# Altium footprint library TarabusLibrary.PcbLib: 591 footprints (part 25 of 37)
Each footprint in its own frame and in the unit in brackets; x right, y up, seen from the top. Pads: shape width x height; smd on the part's side, far side on the other; paste and mask are expansions set on the pad; w line width, h text height; cw(c..) or ccw(c..) is an arc to the next point about the centre after c.
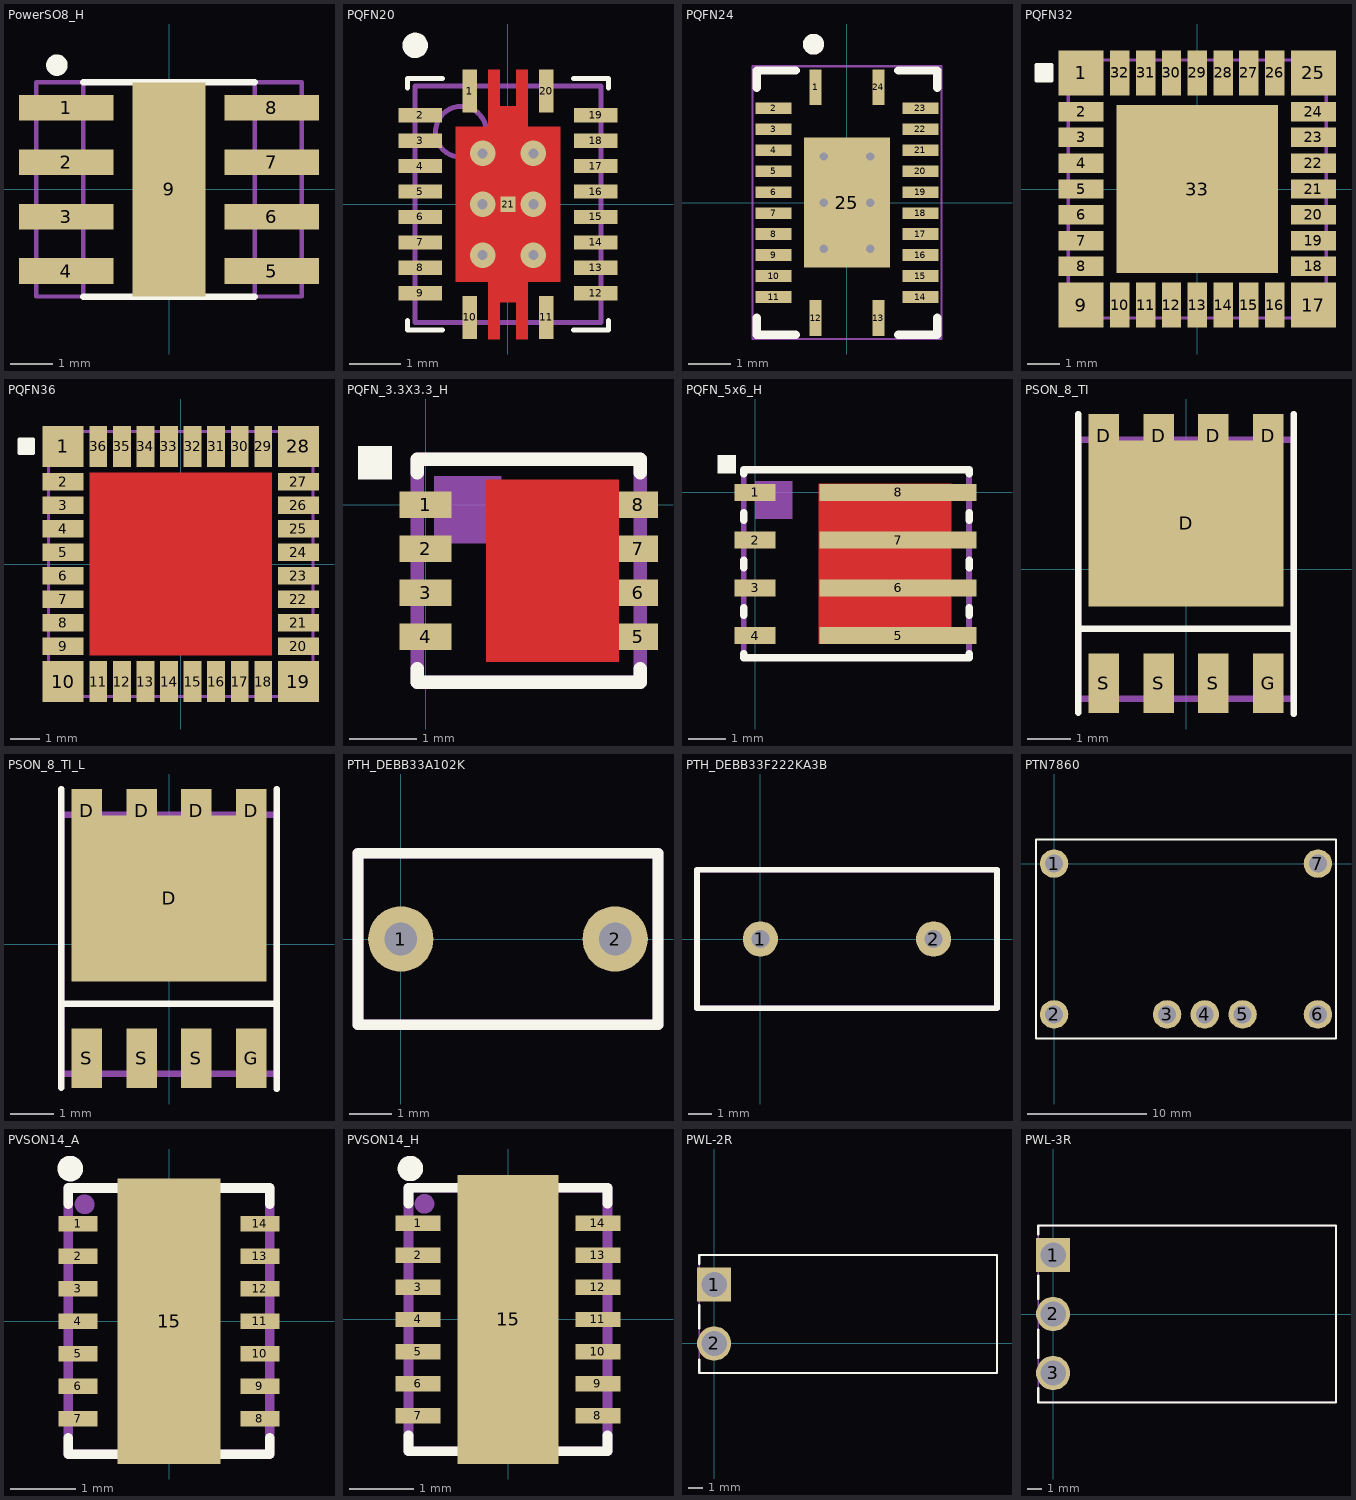
[diagram p24: the footprints below, top view; thin cyan lines are the x and y axes]

## PowerSO8_H [mm]
height 1.75
pads (9):
  rect 2.2x0.6 smd: 1(-2.4,1.905) 2(-2.4,0.635) 3(-2.4,-0.635) 4(-2.4,-1.905) 5(2.4,-1.905) 6(2.4,-0.635) 7(2.4,0.635) 8(2.4,1.905)
  rect 1.7x5 smd: 9(0,0)
Top Overlay:
  circle w0.25: c-2.615,2.9 r0.125
  lines w0.15: -2,-2.5 2,-2.5 ; -2,2.5 2,2.5
Mechanical 7:
  lines w0.1: -2,-2.5 -2,2.5 ; -0.5,2.5 ccw(c0,2.5) 0.5,2.5 ; 2,-2.5 2,2.5 ; -3.1,-2.5 3.1,-2.5 3.1,2.5 -3.1,2.5 -3.1,-2.5
Mechanical 10:
  text ".Comment" at -0.69,-3.25 h0.6
  text ".Designator" at -1,3.02 h0.8
3D body "SOIC127P600-8.STEP": height 1.7, standoff 0, extent -3,-2.54 3,2.54

## PQFN20 [mm] "QFN, 20-Leads, Body 4.5x3.5mm, Pitch 0.5mm, Thermal Pad 3.05x2.05mm, TI Recommended"
height 1
pads (21):
  rect 0.28x0.85 smd paste-0.025 mask+0.07: 1(-0.75,2.225) 10(-0.75,-2.225) 11(0.75,-2.225) 20(0.75,2.225)
  rect 0.85x0.28 smd paste-0.025 mask+0.07: 2(-1.725,1.75) 3(-1.725,1.25) 4(-1.725,0.75) 5(-1.725,0.25) 6(-1.725,-0.25) 7(-1.725,-0.75) 8(-1.725,-1.25) 9(-1.725,-1.75) 12(1.725,-1.75) 13(1.725,-1.25) 14(1.725,-0.75) 15(1.725,-0.25) 16(1.725,0.25) 17(1.725,0.75) 18(1.725,1.25) 19(1.725,1.75)
  rect 0.3x0.3 smd paste-0.15 mask+0: 21(0,0)
via 0.5,-1 diameter 0.5 hole 0.2
via 0.5,0 diameter 0.5 hole 0.2
via 0.5,1 diameter 0.5 hole 0.2
via -0.5,-1 diameter 0.5 hole 0.2
via -0.5,0 diameter 0.5 hole 0.2
via -0.5,1 diameter 0.5 hole 0.2
Top Layer:
  region: 0.16,2.65 0.16,1.925 -0.16,1.925 -0.16,2.65 -0.39,2.65 -0.39,1.525 -1.025,1.525 -1.025,-1.525 -0.39,-1.525 -0.39,-2.65 -0.16,-2.65 -0.16,-1.925 0.16,-1.925 0.16,-2.65 0.39,-2.65 0.39,-1.525 1.025,-1.525 1.025,1.525 0.39,1.525 0.39,2.65
Top Overlay:
  circle w0.25: c-1.825,3.125 r0.125
  lines w0.1: -1.975,-2.29 -1.975,-2.475 -1.29,-2.475 ; -1.975,2.29 -1.975,2.475 -1.29,2.475 ; 1.29,-2.475 1.975,-2.475 1.975,-2.29 ; 1.29,2.475 1.975,2.475 1.975,2.29
Top Paste:
  region: 0.15,1.47 0.15,0.15 0.97,0.15 0.97,1.47
  region: 0.97,-1.47 0.97,-0.15 0.15,-0.15 0.15,-1.47
  region: -0.15,-1.47 -0.15,-0.15 -0.97,-0.15 -0.97,-1.47
  region: -0.97,1.47 -0.97,0.15 -0.15,0.15 -0.15,1.47
  region: 0.39,-2.625 0.39,-1.725 0.16,-1.725 0.16,-2.625
  region: 0.16,2.625 0.16,1.725 0.39,1.725 0.39,2.625
  region: -0.16,-2.625 -0.16,-1.725 -0.39,-1.725 -0.39,-2.625
  region: -0.39,2.625 -0.39,1.725 -0.16,1.725 -0.16,2.625
Mechanical 7:
  lines w0.05: -1.825,-2.325 -1.825,2.325 1.825,2.325 1.825,-2.325 -1.825,-2.325
  lines w0.1: -0.5,0 0.5,0 ; 0,-0.5 0,0.5
Mechanical 9:
  circle w0.1: c-0.925,1.425 r0.5
  lines w0.1: -1.825,-2.325 -1.825,2.325 1.825,2.325 1.825,-2.325 -1.825,-2.325
Mechanical 10:
  text ".Comment" at -1.275,-3.35 h0.7
  text ".Designator" at -1.175,3.125 h0.7
3D body: height 1, standoff 0, extent -1.825,-2.325 1.825,2.325

## PQFN24 [mm] "3.5mm ? 5.5mm QFN-24 Pin"
height 1
pads (25):
  rect 0.28x0.85 smd: 1(-0.75,2.75) 12(-0.75,-2.75) 13(0.75,-2.75) 24(0.75,2.75)
  rect 0.85x0.28 smd: 2(-1.75,2.25) 3(-1.75,1.75) 4(-1.75,1.25) 5(-1.75,0.75) 6(-1.75,0.25) 7(-1.75,-0.25) 8(-1.75,-0.75) 9(-1.75,-1.25) 10(-1.75,-1.75) 11(-1.75,-2.25) 14(1.75,-2.25) 15(1.75,-1.75) 16(1.75,-1.25) 17(1.75,-0.75) 18(1.75,-0.25) 19(1.75,0.25) 20(1.75,0.75) 21(1.75,1.25) 22(1.75,1.75) 23(1.75,2.25)
  rect 2.05x3.1 smd: 25(0,0)
via -0.55,1.1 diameter 0.5 hole 0.2
via 0.55,1.1 diameter 0.5 hole 0.2
via -0.55,0 diameter 0.5 hole 0.2
via 0.55,0 diameter 0.5 hole 0.2
via -0.55,-1.1 diameter 0.5 hole 0.2
via 0.55,-1.1 diameter 0.5 hole 0.2
Top Overlay:
  circle w0.25: c-0.8,3.775 r0.125
  lines w0.2: -2.15,-2.74 -2.15,-3.15 -1.225,-3.15 ; -2.15,2.74 -2.15,3.15 -1.225,3.15 ; 1.225,-3.15 2.15,-3.15 2.15,-2.74 ; 1.225,3.15 2.15,3.15 2.15,2.74
Mechanical 14:
  lines w0.05: -2.25,-3.25 -2.25,3.25 2.25,3.25 2.25,-3.25 -2.25,-3.25
  lines w0.1: -0.5,0 0.5,0 ; 0,-0.5 0,0.5
3D body: height 1, standoff 0.05, extent -2.15,-3.15 2.15,3.15

## PQFN32 [mm]
pads (33):
  rect 1.4x1.4 smd mask+0: 1(-3.6,3.6) 9(-3.6,-3.6) 17(3.6,-3.6) 25(3.6,3.6)
  rect 1.4x0.6 smd mask+0: 2(-3.6,2.4) 3(-3.6,1.6) 4(-3.6,0.8) 5(-3.6,0) 6(-3.6,-0.8) 7(-3.6,-1.6) 8(-3.6,-2.4) 18(3.6,-2.4) 19(3.6,-1.6) 20(3.6,-0.8) 21(3.6,0) 22(3.6,0.8) 23(3.6,1.6) 24(3.6,2.4)
  rect 0.6x1.4 smd mask+0: 10(-2.4,-3.6) 11(-1.6,-3.6) 12(-0.8,-3.6) 13(0,-3.6) 14(0.8,-3.6) 15(1.6,-3.6) 16(2.4,-3.6) 26(2.4,3.6) 27(1.6,3.6) 28(0.8,3.6) 29(0,3.6) 30(-0.8,3.6) 31(-1.6,3.6) 32(-2.4,3.6)
  rect 5x5.2 smd mask+0: 33(0,0)
Top Overlay:
  rectangle: -5,3.35 -4.5,3.85
  lines w0.1: -5,3.35 -5,3.85 -4.5,3.85 -4.5,3.35 -5,3.35
Mechanical 7:
  rectangle: -4,3 -3,4
  lines w0.1: -4,3 -3,3 -3,4 ; -4,-4 -4,4 4,4 4,-4 -4,-4
Mechanical 10:
  text ".Comment" at 1.5,-5.5 h0.6
  text ".Designator" at -0.5,5 h0.8
3D body: height 2.2, standoff 0, extent -4,-4 4,4

## PQFN36 [mm]
pads (36):
  rect 1.4x1.4 smd mask+0: 1(-4,4) 10(-4,-4) 19(4,-4) 28(4,4)
  rect 1.4x0.6 smd mask+0: 2(-4,2.8) 3(-4,2) 4(-4,1.2) 5(-4,0.4) 6(-4,-0.4) 7(-4,-1.2) 8(-4,-2) 9(-4,-2.8) 20(4,-2.8) 21(4,-2) 22(4,-1.2) 23(4,-0.4) 24(4,0.4) 25(4,1.2) 26(4,2) 27(4,2.8)
  rect 0.6x1.4 smd mask+0: 11(-2.8,-4) 12(-2,-4) 13(-1.2,-4) 14(-0.4,-4) 15(0.4,-4) 16(1.2,-4) 17(2,-4) 18(2.8,-4) 29(2.8,4) 30(2,4) 31(1.2,4) 32(0.4,4) 33(-0.4,4) 34(-1.2,4) 35(-2,4) 36(-2.8,4)
Top Layer:
  region: -3.1,3.1 3.1,3.1 3.1,-3.1 -3.1,-3.1
Top Overlay:
  rectangle: -5.5,3.75 -5,4.25
  lines w0.1: -5.5,3.75 -5,3.75 -5,4.25 -5.5,4.25 -5.5,3.75
Mechanical 7:
  rectangle: -4.5,3.5 -3.5,4.5
  lines w0.1: -4.5,3.5 -3.5,3.5 -3.5,4.5 ; -4.5,-4.5 4.5,-4.5 4.5,4.5 -4.5,4.5 -4.5,-4.5
Mechanical 10:
  text ".Designator" at -0.5,5 h0.8
  text ".Comment" at 1.5,-5.5 h0.6
3D body: height 2.2, standoff 0, extent -4.5,-4.5 4.5,4.5

## PQFN_3.3X3.3_H [mm]
height 1
pads (8):
  rect 0.77x0.39 smd: 1(0,0) 2(0,-0.65) 3(0,-1.3) 4(0,-1.95)
  rect 0.58x0.39 smd: 5(3.15,-1.95) 6(3.15,-1.3) 7(3.15,-0.65) 8(3.15,0)
Top Layer:
  region: 0.9,0.375 0.9,-2.325 2.86,-2.325 2.86,0.375
Top Overlay:
  rectangle: -1,0.375 -0.5,0.875
  lines w0.2: -0.125,-2.425 -0.125,-2.625 3.175,-2.625 3.175,-2.425 ; -0.125,0.475 -0.125,0.675 3.175,0.675 3.175,0.475
Mechanical 7:
  rectangle: 0.125,-0.575 1.125,0.425
  lines w0.2: -0.125,-2.625 3.175,-2.625 3.175,0.675 -0.125,0.675 -0.125,-2.625
Mechanical 10:
  text ".Designator" at 0.25,1 h0.8
  text ".Comment" at 1,-3.25 h0.6
3D body: height 1, standoff 0, extent -0.125,-2.625 3.175,0.675

## PQFN_5x6_H [mm]
pads (8):
  rect 1.08x0.45 smd: 1(0,0) 2(0,-1.27) 3(0,-2.54) 4(0,-3.81)
  rect 4.18x0.45 smd: 5(3.81,-3.81) 6(3.81,-2.54) 7(3.81,-1.27) 8(3.81,0)
Top Layer:
  region: 1.7,0.23 1.7,-4.03 5.23,-4.03 5.23,0.23
Top Overlay:
  rectangle: -1,0.5 -0.5,1
  lines w0.2: -0.3,-4.3 -0.3,-4.4 5.7,-4.4 5.7,-4.3 ; -0.3,-3.275 -0.3,-3.075 ; -0.3,-2.005 -0.3,-1.805 ; -0.3,-0.735 -0.3,-0.535 ; -0.3,0.5 -0.3,0.6 5.7,0.6 5.7,0.5 ; 5.7,-3.275 5.7,-3.075 ; 5.7,-2.005 5.7,-1.805 ; 5.7,-0.735 5.7,-0.535
Mechanical 7:
  rectangle: 0,-0.7 1,0.3
  lines w0.15: -0.3,-4.4 -0.3,0.6 5.7,0.6 5.7,-4.4 -0.3,-4.4
Mechanical 10:
  text ".Designator" at 2.52,0.85 h0.8
  text ".Comment" at 2.52,-5.01 h0.6
3D body: height 0.9, standoff 0, extent -0.3,-4.4 5.7,0.6

## PSON_8_TI [mm]
height 1
pads (9):
  rect 0.71x1 smd: D(-1.905,3.098) D(-0.635,3.098) D(0.635,3.098) D(1.905,3.098)
  rect 4.52x3.85 smd: D(0,1.064)
  rect 0.71x1.375 smd: G(1.905,-2.641) S(-1.905,-2.641) S(-0.635,-2.641) S(0.635,-2.641)
Top Overlay:
  lines w0.15: -2.5,-3.325 -2.5,3.6 ; -2.5,-1.375 2.5,-1.375 ; 2.5,-3.35 2.5,3.6
Mechanical 7:
  lines w0.15: -2.5,-3 -2.5,3 2.5,3 2.5,-3 -2.5,-3
Mechanical 10:
  text ".Designator" at -1.075,-4.2 h0.7
  text ".Comment" at -1.125,4.05 h0.7
3D body: height 1, standoff 0.05, extent -2.5,-3 2.5,3

## PSON_8_TI_L [mm]
height 1
pads (9):
  rect 0.71x1 smd: D(-1.905,3.098) D(-0.635,3.098) D(0.635,3.098) D(1.905,3.098)
  rect 4.52x3.85 smd: D(0,1.064)
  rect 0.71x1.375 smd: G(1.905,-2.641) S(-1.905,-2.641) S(-0.635,-2.641) S(0.635,-2.641)
Top Overlay:
  lines w0.15: -2.5,-3.325 -2.5,3.6 ; -2.5,-1.375 2.5,-1.375 ; 2.5,-3.35 2.5,3.6
Mechanical 7:
  lines w0.15: -2.5,-3 2.5,-3 2.5,3 -2.5,3 -2.5,-3
Mechanical 10:
  text ".Comment" at -1.125,4.05 h0.7
  text ".Designator" at -1.075,-4.2 h0.7
3D body: height 1, standoff 0.05, extent -2.5,-3 2.5,3

## PTH_DEBB33A102K [mil]
pads (2):
  round 60 hole 30: 1(0,0) 2(196.85,0)
Top Overlay:
  lines w10: -39.37,-78.74 236.22,-78.74 236.22,78.74 -39.37,78.74 -39.37,-78.74
Mechanical 7:
  lines w10: -39.37,-78.74 -39.37,78.74 236.22,78.74 236.22,-78.74 -39.37,-78.74

## PTH_DEBB33F222KA3B [mil]
pads (2):
  round 60 hole 30: 1(0,0) 2(295.28,0)
Top Overlay:
  lines w10: -108.27,-118.11 -108.27,118.11 403.54,118.11 403.54,-118.11 -108.27,-118.11
Mechanical 7:
  lines w10: -108.27,-118.11 403.54,-118.11 403.54,118.11 -108.27,118.11 -108.27,-118.11

## PTN7860 [mm]
pads (7):
  round 2.4 hole 1.5 mask+0: 1(0,0) 2(0,-12.7) 3(9.52,-12.7) 4(12.7,-12.7) 5(15.88,-12.7) 6(22.23,-12.7) 7(22.23,0)
Top Overlay:
  lines w0.15: -1.52,-14.73 23.75,-14.73 23.75,2.03 -1.52,2.03 -1.52,-14.73
3D body: height 9, standoff 2, extent -1.52,-14.73 23.75,2.03

## PVSON14_A [mm]
pads (15):
  rect 0.6x0.24 smd: 1(-1.4,1.5) 2(-1.4,1) 3(-1.4,0.5) 4(-1.4,0) 5(-1.4,-0.5) 6(-1.4,-1) 7(-1.4,-1.5) 8(1.4,-1.5) 9(1.4,-1) 10(1.4,-0.5) 11(1.4,0) 12(1.4,0.5) 13(1.4,1) 14(1.4,1.5)
  rect 1.58x4.4 smd: 15(0,0)
Top Overlay:
  circle w0.254: c-1.521,2.35 r0.071
  lines w0.15: -1.55,-1.8 -1.55,-2.05 1.55,-2.05 1.55,-1.8 ; -1.55,1.8 -1.55,2.05 1.55,2.05 1.55,1.8
Mechanical 7:
  circle w0.254: c-1.3,1.8 r0.025
  lines w0.15: -1.55,-2.05 1.55,-2.05 1.55,2.05 -1.55,2.05 -1.55,-2.05
Mechanical 10:
  text ".Designator" at -1.25,3.075 h0.8
  text ".Comment" at -1.225,2.5 h0.6
3D body "PVSON14.STEP": height 1, standoff 0, extent -1.575,-2.075 1.575,2.075

## PVSON14_H [mm]
pads (15):
  rect 0.7x0.24 smd: 1(-1.4,1.5) 2(-1.4,1) 3(-1.4,0.5) 4(-1.4,0) 5(-1.4,-0.5) 6(-1.4,-1) 7(-1.4,-1.5) 8(1.4,-1.5) 9(1.4,-1) 10(1.4,-0.5) 11(1.4,0) 12(1.4,0.5) 13(1.4,1) 14(1.4,1.5)
  rect 1.58x4.5 smd: 15(0,0)
Top Overlay:
  circle w0.254: c-1.521,2.35 r0.071
  lines w0.15: -1.55,-1.8 -1.55,-2.05 1.55,-2.05 1.55,-1.8 ; -1.55,1.8 -1.55,2.05 1.55,2.05 1.55,1.8
Mechanical 7:
  circle w0.254: c-1.3,1.8 r0.025
  lines w0.15: -1.55,-2.05 -1.55,2.05 1.55,2.05 1.55,-2.05 -1.55,-2.05
Mechanical 10:
  text ".Comment" at -1.225,2.5 h0.6
  text ".Designator" at -1.25,3.075 h0.8
3D body "PVSON14.STEP": height 1, standoff 0, extent -1.575,-2.075 1.575,2.075

## PWL-2R [mm]
height 10.2
pads (2):
  rect 2.3x2.3 hole 1.7: 1(0,3.96)
  round 2.3 hole 1.7: 2(0,0)
Top Overlay:
  lines w0.15: -1,-1.98 19,-1.98 19,5.94 -1,5.94 -1,5.35 ; -1,-1.975 -1,-1.1 ; -1,1 -1,2.575
Mechanical 7:
  lines w0.1: -1,-1.98 19,-1.98 19,5.94 -1,5.94 -1,-1.98
Mechanical 10:
  text ".Comment" at 7.955,6.66 h0.6
  text ".Designator" at 7.945,7.23 h0.8
3D body: height 10.2, standoff 0, extent -1,-1.98 19,5.94

## PWL-3R [mm]
height 10.2
pads (3):
  rect 2.3x2.3 hole 1.7: 1(0,3.96)
  round 2.3 hole 1.7: 2(0,0) 3(0,-3.96)
Top Overlay:
  lines w0.15: -1,-4.975 -1,-5.94 19,-5.94 19,5.94 -1,5.94 -1,5.35 ; -1,-2.95 -1,-1.05 ; -1,1.025 -1,2.575
Mechanical 7:
  lines w0.1: -1,-5.94 19,-5.94 19,5.94 -1,5.94 -1,-5.94
Mechanical 10:
  text ".Designator" at 7.945,7.23 h0.8
  text ".Comment" at 7.955,6.66 h0.6
3D body: height 10.2, standoff 0, extent -1,-5.94 19,5.94